# Altium footprint library swatpcblib.PcbLib: 202 footprints (part 3 of 13)
Each footprint in its own frame and in the unit in brackets; x right, y up, seen from the top. Pads: shape width x height; smd on the part's side, far side on the other; paste and mask are expansions set on the pad; w line width, h text height; cw(c..) or ccw(c..) is an arc to the next point about the centre after c.
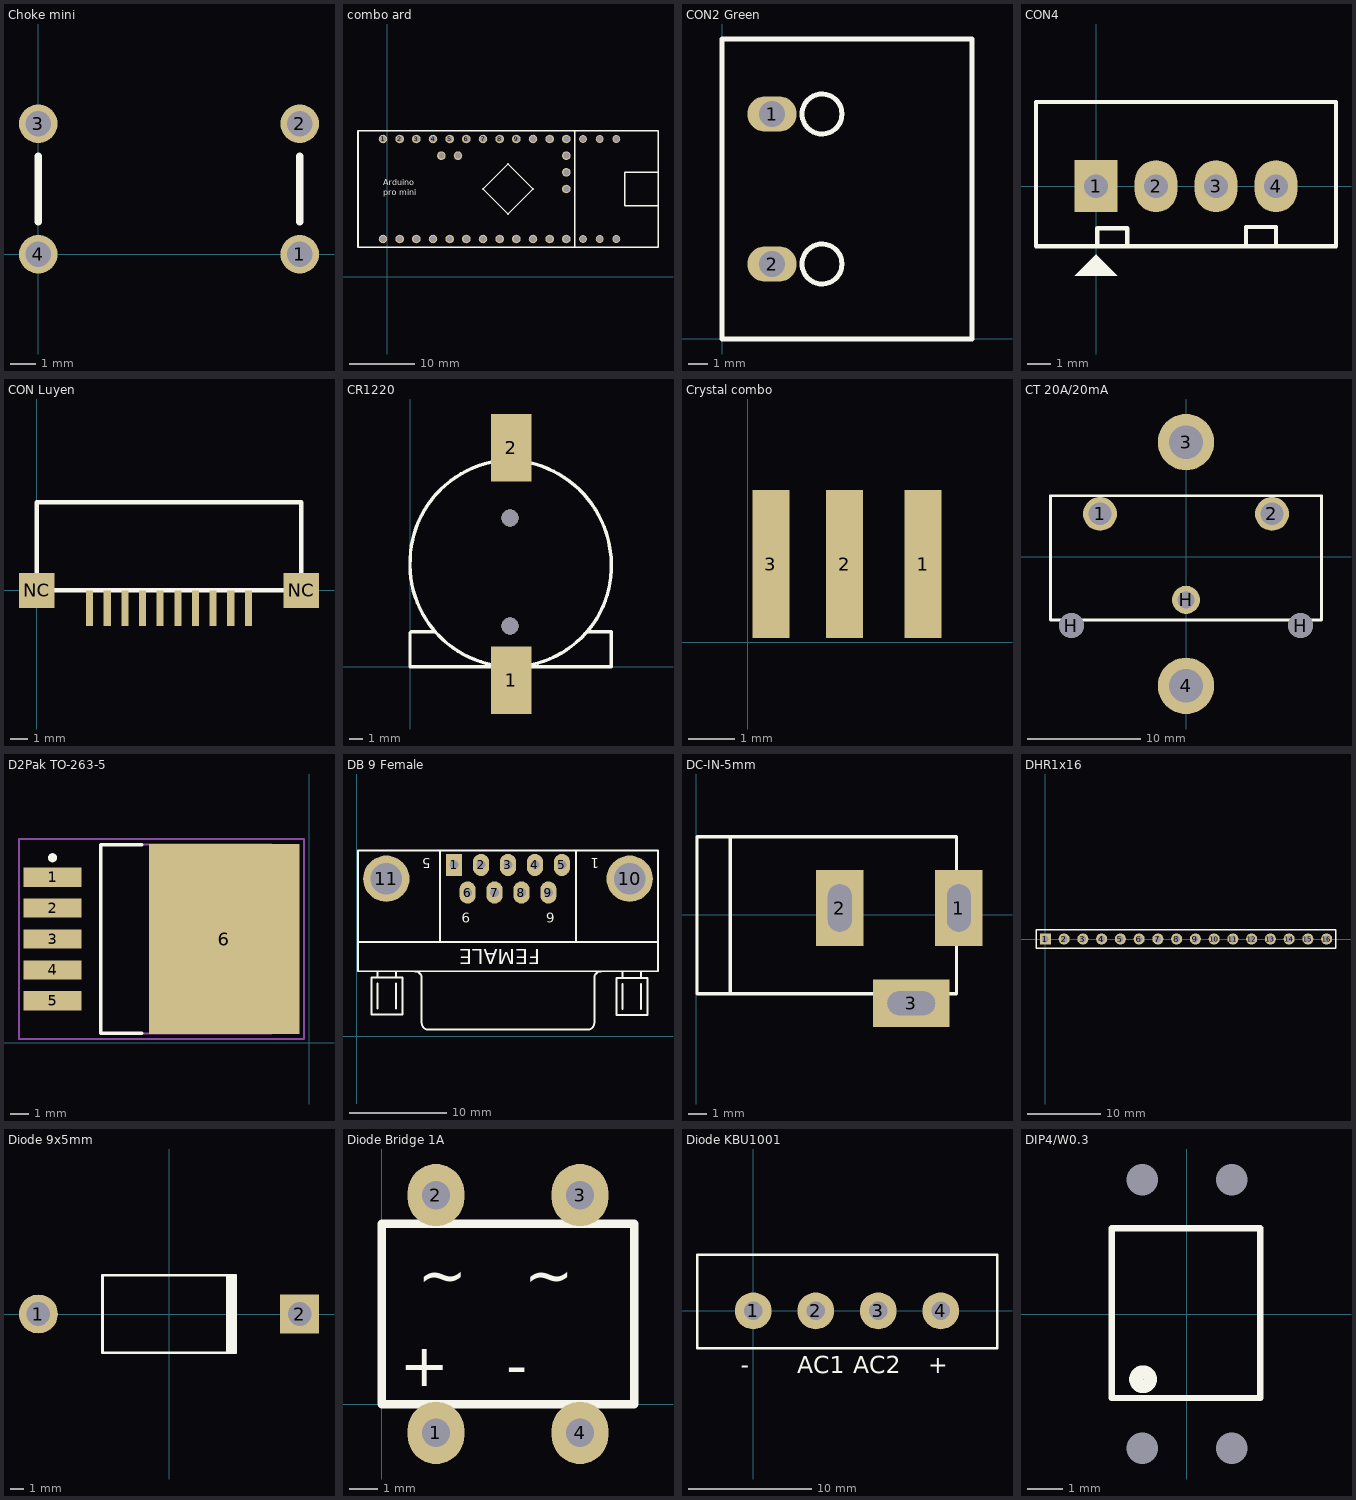
[diagram p2: the footprints below, top view; thin cyan lines are the x and y axes]

## Choke mini [mm]
pads (4):
  round 1.5 hole 1: 1(10.16,0) 2(10.16,5.08) 3(0,5.08) 4(0,0)
Top Overlay:
  lines w0.3: 0,1.27 0,3.81 ; 10.16,1.27 10.16,3.81

## combo ard [mm]
pads (35):
  round 1.3 hole 0.9: 1(-0.635,20.955) 2(1.905,20.955) 3(4.445,20.955) 4(6.985,20.955) 5(9.525,20.955) 6(12.065,20.955) 7(14.605,20.955) 8(17.145,20.955) 9(19.685,20.955) 10(22.225,20.955) 11(24.765,20.955) 12(27.305,20.955) 13(8.255,18.415) 14(10.795,18.415) 15(27.305,18.415) 16(27.305,15.875) 17(27.305,13.335) 18(27.305,5.715) 19(24.765,5.715) 20(22.225,5.715) 21(19.685,5.715) 22(17.145,5.715) 23(14.605,5.715) 24(12.065,5.715) 25(9.525,5.715) 26(6.985,5.715) 27(4.445,5.715) 28(1.905,5.715) 29(-0.635,5.715)
  round 1.2 hole 0.9: 30(29.845,20.955) 31(32.385,20.955) 32(34.925,20.955) 33(34.925,5.715) 34(32.385,5.715) 35(29.845,5.715)
Top Overlay:
  lines w0.1: -4.445,4.445 -4.445,22.225
  lines w0.2: -4.445,4.445 41.275,4.445 41.275,22.225 -4.445,22.225 ; 41.275,10.795 36.195,10.795 36.195,15.875 41.275,15.875
  lines w0.254: -4.445,4.445 28.575,4.445 28.575,22.225 -4.445,22.225 -4.445,4.445 ; 14.605,13.335 18.415,17.145 22.225,13.335 18.415,9.525 14.605,13.335
  text "Arduino / pro mini" at -0.635,12.065 h1.5
3D body "arduino_nano.X_T": height 17.1, standoff -1.5, extent -4.555,4.2 40.445,22.2

## CON2 Green [mm]
pads (2):
  oval 2.5x1.8 hole 1.3: 1(2.54,11.405) 2(2.54,3.785)
Top Overlay:
  circle w0.254: c5.08,11.405 r1.016
  circle w0.254: c5.08,3.785 r1.016
  lines w0.254: 0,-0.025 12.7,-0.025 12.7,15.215 0,15.215 0,-0.025

## CON4 [mm]
pads (4):
  rect 1.8x2.2 hole 1: 1(0,0)
  oval 1.8x2.2 hole 1: 2(2.54,0) 3(5.08,0) 4(7.62,0)
Top Overlay:
  region: -0.902,-3.797 0.902,-3.797 0.013,-2.908 0.013,-2.883
  lines w0.178: 0.051,-2.54 0.051,-1.778 1.321,-1.778 1.321,-2.54 ; 6.35,-2.489 6.35,-1.727 7.62,-1.727 7.62,-2.489 ; -2.54,-2.54 -2.54,3.556 10.16,3.556 10.16,0 10.16,-2.54 -2.54,-2.54
3D body "User Library-HEADER,JST,BxB-XH-A.STEP": height 7, standoff -3.4, extent -2.286,-2.286 10.114,3.464

## CON Luyen [mm]
pads (12):
  rect 0.4x2 smd: 1(3,-1) 2(4,-1) 3(5,-1) 4(6,-1) 5(7,-1) 6(8,-1) 7(9,-1) 8(10,-1) 9(11,-1) 10(12,-1)
  rect 2x2 smd: NC(0,0) NC(15,0)
Top Overlay:
  lines w0.254: 0,0 15,0 15,5 0,5 0,0

## CR1220 [mm]
pads (2):
  rect 3x5 smd: 1(7.5,-1) 2(7.5,16.2)
via 7.4,11 diameter 1.27 hole 1.27
via 7.4,3 diameter 1.27 hole 1.27
Top Overlay:
  lines w0.254: 0,2.5 0,0 14.9,0 ; 0.1,2.6 1.8,2.6 ; 7,15.3 cw(c7.1,7.5) 14.9,7.6 cw(c7.45,7.45) 7.6,0 cw(c7.55,7.55) 0,7.5 cw(c7.6,7.7) 7.4,15.3 ; 13.1,2.6 14.9,2.6 14.9,0 ; 14.9,0.1 14.9,2.5 ; 14.9,0.2 14.9,0
3D body "User Library-Battery Holder for CR1220 SMD.STEP": height 4.23, standoff -0.52, extent -0.017,-2.036 14.732,16.764

## Crystal combo [mm]
pads (3):
  rect 0.8x3.2 smd: 1(3.803,1.7) 2(2.103,1.7) 3(0.503,1.7)

## CT 20A/20mA [mm] "cam bien dong 20A/20mA"
pads (7):
  round 3 hole 2: 1(-7.62,3.81) 2(7.62,3.81)
  round 5 hole 3: 3(0,10.16) 4(0,-11.43)
  round 2.2 hole 2.2: H(-10.16,-6.096) H(10.16,-6.096)
  round 2.5 hole 1.5: H(0,-3.81)
Top Overlay:
  lines w0.254: -12,-5.59 12,-5.59 12,5.41 -12,5.41 -12,-5.59
3D body "ac-1020.stp": height 23.82, standoff -5.61, extent -11.794,-5.664 12.026,5.456

## D2Pak TO-263-5 [mm] "MIC"
height 3.81
pads (6):
  rect 3.2x1.05 smd: 1(-14.128,9.115) 2(-14.128,7.415) 3(-14.128,5.715) 4(-14.128,4.015) 5(-14.128,2.315)
  rect 8.3x10.45 smd: 6(-4.678,5.715)
Top Overlay:
  circle w0.25: c-14.128,10.19 r0.125
  lines w0.2: -9.228,0.515 -11.478,0.515 -11.478,10.915 -9.228,10.915
Mechanical 13:
  lines w0.1: -11.478,0.515 -2.078,0.515 -2.078,10.915 -11.478,10.915 -11.478,0.515
Mechanical 15:
  lines w0.1: -8.628,5.715 -7.628,5.715 ; -8.128,5.215 -8.128,6.215 ; -15.978,0.215 -0.278,0.215 -0.278,11.215 -15.978,11.215 -15.978,0.215
3D body: height 4.65, standoff 0, extent -11.478,0.515 -2.078,10.915

## DB 9 Female [mil] "COM DB 9 Female"
pads (11):
  rect 65x90 hole 35: 1(393.89,692.91)
  oval 65x90 hole 35: 2(502.95,692.91) 3(612,692.91) 4(721.06,692.91) 5(830.11,692.91) 6(448.42,581.09) 7(557.47,581.09) 8(666.53,581.09) 9(775.58,581.09)
  round 187.4 hole 128.35: 10(1103.93,637) 11(120.07,637)
Top Overlay:
  lines w7.87: 5.7,381.09 1218.3,381.09 ; 235.62,262.79 cw(c235.62,235.43) 262.98,235.43 262.98,54.32 ; 263.18,54.13 ccw(c290.54,54.13) 290.54,26.76 933.46,26.76 ccw(c933.46,54.13) 960.82,54.13 ; 336.41,381.09 336.41,751.17 ; 887.59,381.09 887.59,751.17 ; 961.02,54.32 961.02,235.43 cw(c988.38,235.43) 988.38,262.79 ; 5.7,262.98 5.7,751.17 1218.3,751.17 1218.3,262.98 5.7,262.98
  lines w8: 85,112.98 85,212.98 ; 85,237.98 85,262.98 ; 160,112.98 160,212.98 ; 160,237.98 160,262.98 ; 1075,110.98 1075,210.98 ; 1075,235.98 1075,260.98 ; 1150,110.98 1150,210.98 ; 1150,235.98 1150,260.98 ; 60,87.98 60,237.98 185,237.98 185,87.98 60,87.98 ; 1050,85.98 1050,235.98 1175,235.98 1175,85.98 1050,85.98
  text "FEMALE" at 742,352 h60
  text "1" at 980,720 h40
  text "5" at 300,720 h40
  text "9" at 460,500 h40
  text "6" at 800,500 h40
3D body "DB9 - 203-09SCKKBE.STEP": height 490.16, standoff -179.13, extent 5,17 1217.99,747.32

## DC-IN-5mm [mil]
pads (3):
  rect 100x160 hole 50 slot 100 at 90 deg: 1(552,14) 2(302,14)
  rect 160x100 hole 50 slot 100 at 0 deg: 3(452,-186)
Top Overlay:
  lines w7: 72,-166 72,164 ; 2,-166 2,164 547,164 547,-166 2,-166
3D body "SW3dPS-dc range - dc connector[4840.2201].STEP": height 433.67, standoff -137.2, extent 16.65,-191.12 561,183.12

## DHR1x16 [mm]
pads (16):
  rect 1.5x1.5 hole 0.9: 1(0,0)
  round 1.5 hole 0.9: 2(2.54,0) 3(5.08,0) 4(7.62,0) 5(10.16,0) 6(12.7,0) 7(15.24,0) 8(17.78,0) 9(20.32,0) 10(22.86,0) 11(25.4,0) 12(27.94,0) 13(30.48,0) 14(33.02,0) 15(35.56,0) 16(38.1,0)
Top Overlay:
  lines w0.2: -1.27,-1.27 -1.27,1.27 0.635,1.27 39.37,1.27 39.37,-1.27 -1.27,-1.27
3D body: height 1.5, standoff 0, extent 8.89,-1.27 11.43,1.27
3D body: height 7, standoff -1, extent 9.754,-0.406 10.55,0.392
3D body: height 1.5, standoff 0, extent 6.35,-1.27 8.89,1.27
3D body: height 7, standoff -1, extent 7.214,-0.406 8.01,0.392
3D body: height 1.5, standoff 0, extent 3.81,-1.27 6.35,1.27
3D body: height 7, standoff -1, extent 4.674,-0.406 5.47,0.392
3D body: height 1.5, standoff 0, extent 1.27,-1.27 3.81,1.27
3D body: height 7, standoff -1, extent 2.134,-0.406 2.93,0.392
3D body: height 1.5, standoff 0, extent -1.27,-1.27 1.27,1.27
3D body: height 7, standoff -1, extent -0.406,-0.406 0.39,0.392
3D body: height 1.5, standoff 0, extent 21.59,-1.27 24.13,1.27
3D body: height 7, standoff -1, extent 22.454,-0.406 23.25,0.392
3D body: height 1.5, standoff 0, extent 19.05,-1.27 21.59,1.27
3D body: height 7, standoff -1, extent 19.914,-0.406 20.71,0.392
3D body: height 1.5, standoff 0, extent 16.51,-1.27 19.05,1.27
3D body: height 7, standoff -1, extent 17.374,-0.406 18.17,0.392
3D body: height 1.5, standoff 0, extent 13.97,-1.27 16.51,1.27
3D body: height 7, standoff -1, extent 14.834,-0.406 15.63,0.392
3D body: height 1.5, standoff 0, extent 11.43,-1.27 13.97,1.27
3D body: height 7, standoff -1, extent 12.294,-0.406 13.09,0.392
3D body: height 1.5, standoff 0, extent 34.29,-1.27 36.83,1.27
3D body: height 7, standoff -1, extent 35.154,-0.406 35.95,0.392
3D body: height 1.5, standoff 0, extent 31.75,-1.27 34.29,1.27
3D body: height 7, standoff -1, extent 32.614,-0.406 33.41,0.392
3D body: height 1.5, standoff 0, extent 29.21,-1.27 31.75,1.27
3D body: height 7, standoff -1, extent 30.074,-0.406 30.87,0.392
3D body: height 1.5, standoff 0, extent 26.67,-1.27 29.21,1.27
3D body: height 7, standoff -1, extent 27.534,-0.406 28.33,0.392
3D body: height 1.5, standoff 0, extent 24.13,-1.27 26.67,1.27
3D body: height 7, standoff -1, extent 24.994,-0.406 25.79,0.392
3D body: height 1.5, standoff 0, extent 36.83,-1.27 39.37,1.27
3D body: height 7, standoff -1, extent 37.694,-0.406 38.49,0.392

## Diode 9x5mm [mm] "1N5822"
height 5.4
pads (2):
  round 2.8 hole 1.7: 1(-9.425,0.032)
  rect 2.8x2.8 hole 1.7: 2(9.415,0.032)
Top Overlay:
  rectangle: 4.095,-2.768 4.895,2.832
  lines w0.2: 4.795,-2.768 -4.805,-2.768 -4.805,2.832 4.795,2.832

## Diode Bridge 1A [mm]
pads (4):
  oval 2x2.2 hole 1: 1(1.905,-1.016) 2(1.905,7.366) 3(6.985,7.366) 4(6.985,-1.016)
Top Overlay:
  lines w0.3: 0,0 0,6.35 8.89,6.35 8.89,0 0,0
  text "+   -" at 0.635,0.635 h1.52
  text "~   ~" at 1.27,3.81 h1.52
3D body "SW3dPS-DIP-4 300mil Black.STEP": height 3.73, standoff -2.77, extent 0.62,-0.922 8.32,7.061

## Diode KBU1001 [mm] "Diode bridge"
pads (4):
  round 3 hole 1.5: 1(0,0) 2(5.08,0) 3(10.16,0) 4(15.24,0)
Top Overlay:
  lines w0.203: -4.572,-3.048 19.812,-3.048 19.812,4.572 -4.572,4.572 -4.572,-3.048
  text "AC1" at 3.556,-5.08 h1.4
  text "AC2" at 8.128,-5.08 h1.4
  text "-" at -1.016,-5.08 h1.4
  text "+" at 14.224,-5.08 h1.4
3D body "User Library-Silicon Bridge Rectifiers KBU1001.step": height 23.65, standoff -18.65, extent -3.98,-2.54 19.22,4.41

## DIP4/W0.3 [mm] "PC817"
pads (4):
  rect 0x0 / inner rect 0x0 / far side rect 1.5x2.2 hole 0.9: 1(-1.27,-3.81)
  round 0 / inner round 0 / far side oval 1.5x2.2 hole 0.9: 2(1.27,-3.81) 3(1.27,3.81) 4(-1.27,3.81)
Top Overlay:
  circle w0.381: c-1.245,-1.854 r0.203
  lines w0.178: -2.134,-2.388 2.083,-2.388 2.083,2.438 -2.134,2.438 -2.134,-2.388
3D body "User Library-DIP4-7_62-2_54.STEP": height 4.3, standoff -2.7, extent -2.295,-3.94 2.295,3.94